# Altium footprint library FootprintSMD.PcbLib: 140 footprints (part 6 of 9)
Each footprint in its own frame and in the unit in brackets; x right, y up, seen from the top. Pads: shape width x height; smd on the part's side, far side on the other; paste and mask are expansions set on the pad; w line width, h text height; cw(c..) or ccw(c..) is an arc to the next point about the centre after c.
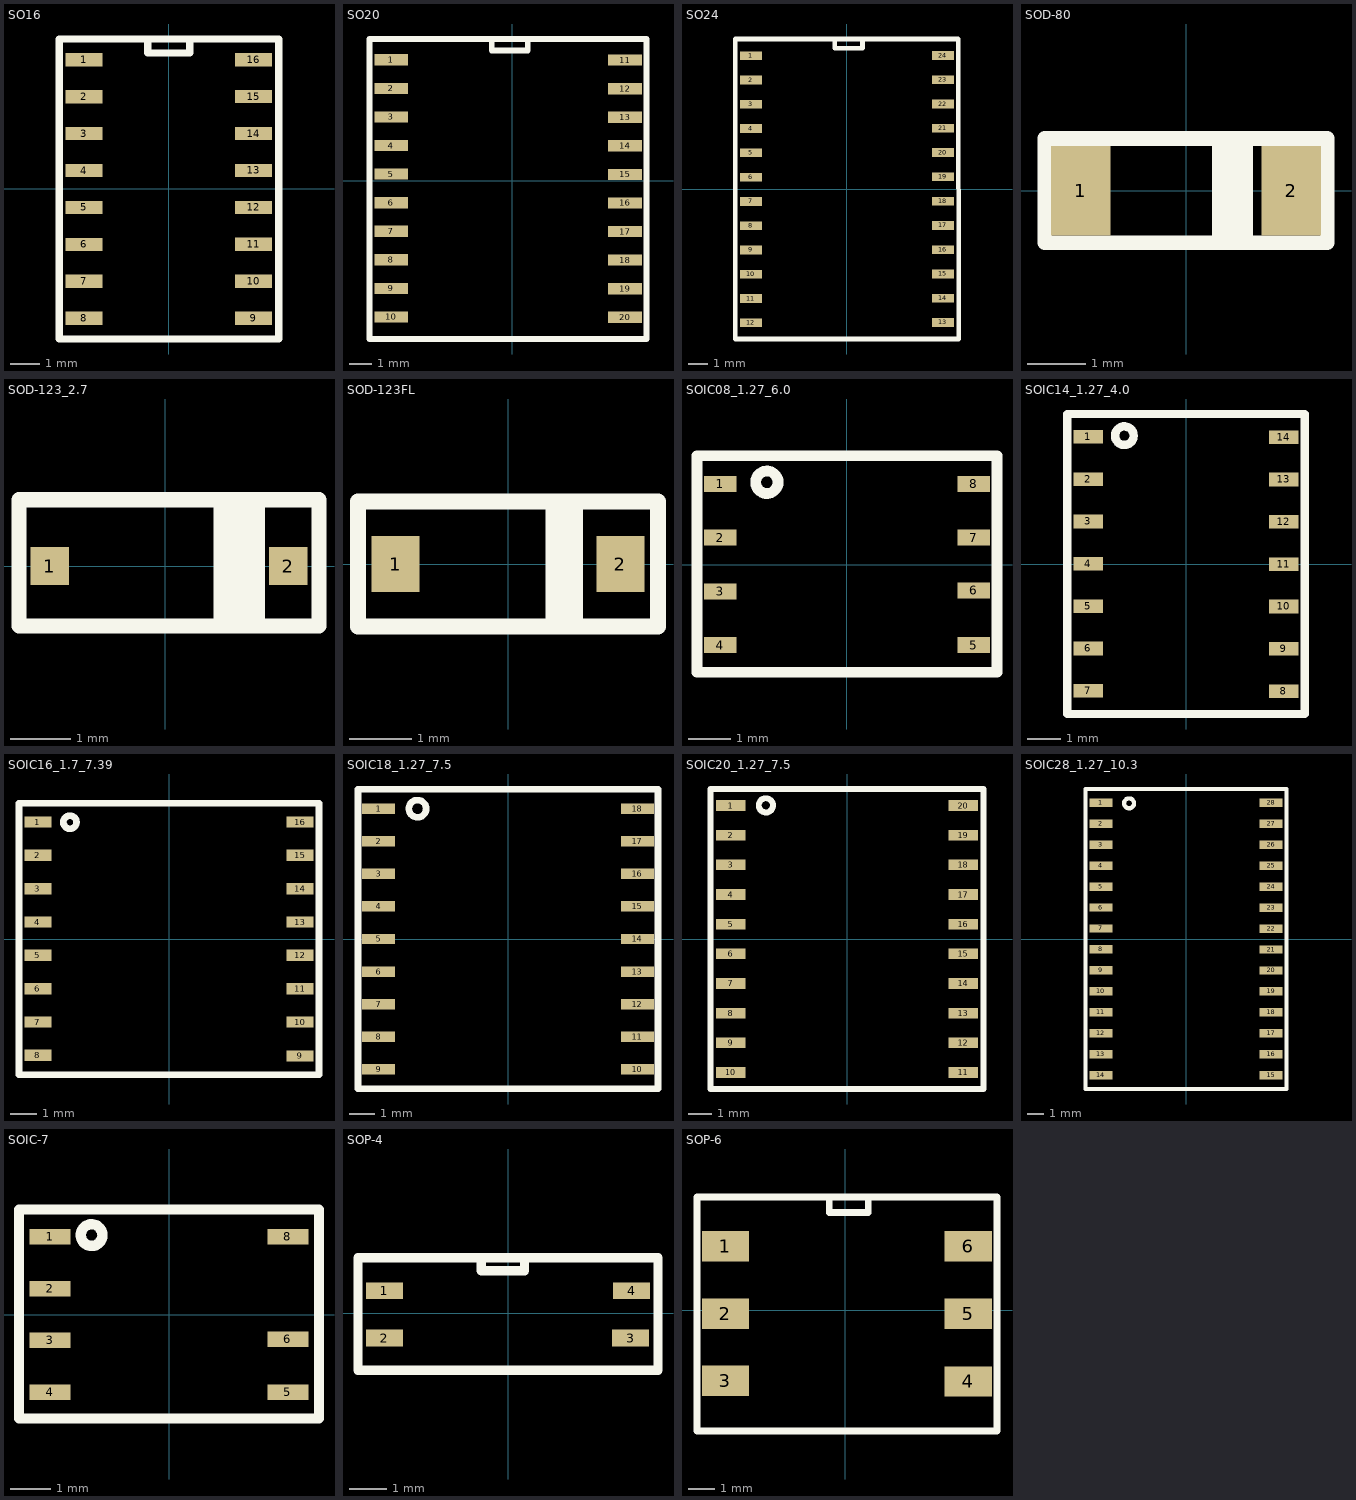
[diagram p5: the footprints below, top view; thin cyan lines are the x and y axes]

## SO16 [mil]
pads (16):
  rect 50x18 smd: 1(-114.78,174.95) 2(-114.78,124.95) 3(-114.78,74.95) 4(-114.78,24.95) 5(-114.78,-25.05) 6(-114.78,-75.05) 7(-114.78,-125.05) 8(-114.78,-175.05) 9(114.78,-174.95) 10(114.78,-124.95) 11(114.78,-74.95) 12(114.78,-24.95) 13(114.78,25.05) 14(114.78,75.05) 15(114.78,125.05) 16(114.78,175.05)
Top Overlay:
  lines w10: -28.78,202.95 -28.78,183.95 28.22,183.95 28.22,196.45 ; -148.28,-203.05 148.72,-203.05 148.72,202.95 -148.28,202.95 -148.28,-203.05
3D body "User Library-so16-1.STEP": height 68.7, standoff -0.72, extent -121.1,-196.3 120.51,196.21

## SO20 [mm]
pads (20):
  rect 1.5x0.5 smd: 1(-5.383,5.374) 2(-5.383,4.104) 3(-5.383,2.834) 4(-5.383,1.564) 5(-5.383,0.294) 6(-5.383,-0.976) 7(-5.383,-2.246) 8(-5.383,-3.516) 9(-5.383,-4.786) 10(-5.383,-6.056) 11(5.01,5.362) 12(5.01,4.092) 13(5.01,2.822) 14(5.01,1.552) 15(5.01,0.282) 16(5.01,-0.988) 17(5.01,-2.258) 18(5.01,-3.528) 19(5.01,-4.798) 20(5.01,-6.068)
Top Overlay:
  lines w0.254: -0.914,6.248 -0.914,5.791 0.686,5.791 0.686,6.248 ; -6.35,-7.036 5.969,-7.036 5.969,6.299 -6.35,6.299 -6.35,-7.036
3D body "User Library-SOIC20_JEDEC_MS-013AC.STEP": height 2.66, standoff 0, extent -5.536,-6.851 5.094,6.149

## SO24 [mil]
pads (24):
  rect 45x18 smd: 1(-197.83,274.7) 2(-197.83,224.7) 3(-197.83,174.7) 4(-197.83,124.7) 5(-197.83,74.7) 6(-197.83,24.7) 7(-197.83,-25.3) 8(-197.83,-75.3) 9(-197.83,-125.3) 10(-197.83,-175.3) 11(-197.83,-225.3) 12(-197.83,-275.3) 13(197.83,-274.7) 14(197.83,-224.7) 15(197.83,-174.7) 16(197.83,-124.7) 17(197.83,-74.7) 18(197.83,-24.7) 19(197.83,25.3) 20(197.83,75.3) 21(197.83,125.3) 22(197.83,175.3) 23(197.83,225.3) 24(197.83,275.3)
Top Overlay:
  lines w10: -25.03,308.3 -25.03,290.3 31.97,290.3 31.97,307.3 ; -230,-308.7 230.42,-308.7 229.42,309.3 -230,309.3 -230,-308.7
3D body "User Library-SO-24W.STEP": height 97.64, standoff 0, extent -202.95,-303.84 202.95,302.85

## SOD-80 [mil]
pads (2):
  rect 40x60 smd: 1(-70.87,0) 2(70.87,0)
Top Overlay:
  rectangle: 17.56,-35 45,37.32
  lines w10: -95,-35 -95,35 95,35 95,-35 -95,-35
3D body "SOD-80.STEP": height 57.53, standoff -1.53, extent -68.9,-29.53 68.9,29.41

## SOD-123_2.7 [mil]
pads (2):
  rect 25x25 smd: 1(-75,0) 2(80,0)
Top Overlay:
  rectangle: 31.5,-40.35 64.96,42.32
  lines w10: -95,-39.03 -95,42.97 100,42.97 100,-39.03 -95,-39.03
3D body "User Library-SOD123-1.STEP": height 46.46, standoff 0, extent -76.77,-35.43 76.77,35.43

## SOD-123FL [mil]
pads (2):
  rect 30x35 smd: 1(-70.87,0) 2(70.87,0)
Top Overlay:
  rectangle: 23.62,-39.37 47.24,39.37
  lines w10: -94.49,-39.37 -94.49,39.37 94.49,39.37 94.49,-39.37 -94.49,-39.37
3D body "User Library-SOD-123FL.STEP": height 37.44, standoff 0.25, extent -70.62,-32.48 70.61,32.48

## SOIC08_1.27_6.0 [mil]
pads (8):
  rect 30x15 smd: 1(-118.27,75.3) 2(-118.27,25.1) 3(-118.27,-25.1) 4(-118.27,-75.3) 5(118.27,-75.3) 6(118.27,-24.11) 7(118.27,25.1) 8(118.27,75.3)
Top Overlay:
  circle w10: c-74.8,76.77 r10.46
  lines w10: -140,-100.5 140,-100.5 140,101.5 -140,101.5 -140,-100.5
3D body "User Library-SOIC-8-1.STEP": height 68.9, standoff 0, extent -118.11,-96.45 118.11,96.46

## SOIC14_1.27_4.0 [mil]
pads (14):
  rect 35x16 smd: 1(-115.31,150.2) 2(-115.31,100.2) 3(-115.31,50.2) 4(-115.31,0.2) 5(-115.31,-49.8) 6(-115.31,-99.8) 7(-115.31,-149.8) 8(115.31,-150.2) 9(115.31,-100.2) 10(115.31,-50.2) 11(115.31,-0.2) 12(115.31,49.8) 13(115.31,99.8) 14(115.31,149.8)
Top Overlay:
  circle w10: c-72.83,151.57 r11
  lines w10: -140,-177.17 140,-177.17 140,177.17 -140,177.17 -140,-177.17
3D body "User Library-SOIC-14.STEP": height 68.9, standoff 0, extent -118.11,-172.24 118.11,172.25

## SOIC16_1.7_7.39 [mil]
pads (16):
  rect 40x17 smd: 1(-196.61,175.49) 2(-196.61,125.49) 3(-196.61,75.49) 4(-196.61,25.49) 5(-196.61,-24.51) 6(-196.61,-74.51) 7(-196.61,-124.51) 8(-196.61,-174.51) 9(196.61,-175.49) 10(196.61,-124.51) 11(196.61,-74.51) 12(196.61,-24.5) 13(196.61,25.49) 14(196.61,75.49) 15(196.61,125.49) 16(196.61,175.49)
Top Overlay:
  circle w10: c-148.62,175.2 r9.84
  lines w10: -225,-203.74 -225,203.74 225,203.74 225,-203.74 -225,-203.74
3D body "SOIC16 wide.stp": height 78.74, standoff 0.13, extent -200.06,-198.42 200.06,198.43

## SOIC18_1.27_7.5 [mil]
pads (18):
  rect 50x16 smd: 1(-198.52,200) 2(-198.52,150) 3(-198.52,100) 4(-198.52,50) 5(-198.52,0) 6(-198.52,-50) 7(-198.52,-100) 8(-198.52,-150) 9(-198.52,-200) 10(198.52,-200) 11(198.52,-150) 12(198.52,-100) 13(198.52,-50) 14(198.52,0) 15(198.52,50) 16(198.52,100) 17(198.52,150) 18(198.52,200)
Top Overlay:
  circle w10: c-138.78,199.8 r13.24
  lines w10: -230,-229.33 -230,229.33 230,229.33 230,-229.33 -230,-229.33
3D body "SOIC18 wide.stp": height 78.6, standoff -0.01, extent -200.06,-223.42 200.06,223.43

## SOIC20_1.27_7.5 [mil]
pads (20):
  rect 50x18 smd: 1(-196.1,225) 2(-196.1,175) 3(-196.1,125) 4(-196.1,75) 5(-196.1,25) 6(-196.1,-25) 7(-196.1,-75) 8(-196.1,-125) 9(-196.1,-175) 10(-196.1,-225) 11(196.1,-225) 12(196.1,-175) 13(196.1,-125) 14(196.1,-75) 15(196.1,-25) 16(196.1,25) 17(196.1,75) 18(196.1,125) 19(196.1,175) 20(196.1,225)
Top Overlay:
  circle w10: c-136.81,225.39 r12.01
  lines w10: -230,-252.95 -230,252.95 230,252.95 230,-252.95 -230,-252.95
3D body "User Library-SOIC20.STEP": height 86.61, standoff -1.47, extent -199.48,-248.03 199.5,248.03

## SOIC28_1.27_10.3 [mil]
pads (28):
  rect 55x20 smd: 1(-203.07,325.1) 2(-203.07,275.1) 3(-203.07,225.1) 4(-203.07,175.1) 5(-203.07,125.1) 6(-203.07,75.1) 7(-203.07,25.1) 8(-203.07,-24.9) 9(-203.07,-74.9) 10(-203.07,-124.9) 11(-203.07,-174.9) 12(-203.07,-224.9) 13(-203.07,-274.9) 14(-203.07,-324.9) 15(203.07,-325.1) 16(203.07,-275.1) 17(203.07,-225.1) 18(203.07,-175.1) 19(203.07,-125.1) 20(203.07,-75.1) 21(203.07,-25.1) 22(203.07,24.9) 23(203.07,74.9) 24(203.07,124.9) 25(203.07,174.9) 26(203.07,224.9) 27(203.07,274.9) 28(203.07,324.9)
Top Overlay:
  circle w10: c-135.83,323.82 r11.85
  lines w10: -240,-357.99 -240,358.01 240,358.01 240,-357.99 -240,-357.99
3D body "SW3dPS-SOIC28-300.STEP": height 104.33, standoff 0, extent -202.87,-352.46 202.65,352.26

## SOIC-7 [mil]
pads (7):
  rect 40x15 smd: 1(-115,75.3) 2(-115,25.1) 3(-115,-25.1) 4(-115,-75.3) 5(115,-75.3) 6(115,-24.11) 8(115,75.3)
Top Overlay:
  circle w10: c-74.8,76.77 r10.46
  lines w10: -145,-100.5 145,-100.5 145,101.5 -145,101.5 -145,-100.5
3D body "User Library-SOIC-7.STEP": height 68.9, standoff 0, extent -118.11,-96.46 118.11,96.45

## SOP-4 [mm]
pads (4):
  rect 1x0.45 smd: 1(-3.35,0.6) 2(-3.35,-0.675) 3(3.3,-0.675) 4(3.325,0.6)
Top Overlay:
  lines w0.254: -0.737,1.499 -0.737,1.143 0.127,1.143 0.432,1.143 0.432,1.499 ; -4.064,-1.549 -4.064,1.499 4.039,1.499 4.039,-1.549 -4.064,-1.549
3D body "User Library-SOP-4-1.STEP": height 2.1, standoff 0, extent -3.5,-1.425 3.5,1.375

## SOP-4L/TCLT100 [mil]
3D body "User Library-TCLT100-SOP4L.STEP": height 39.37, standoff -44.09, extent -200.78,-80.7 200.79,80.71

## SOP-6 [mil]
pads (6):
  rect 70x45 smd: 1(-177.94,95.2) 2(-177.94,-5.19) 3(-177.94,-104.6) 4(182.29,-105.58) 5(182.29,-5.19) 6(182.29,95.2)
Top Overlay:
  lines w10: -24,167 -24,145 34,145 34,167 ; -220,-179 -220,168 225,168 225,-179 -220,-179
3D body "User Library-SOP-6.STEP": height 157.48, standoff -2.95, extent -177.94,-172.71 182.88,162.33